# Altium footprint library Global Library.PcbLib: 82 footprints (part 6 of 6)
Each footprint in its own frame and in the unit in brackets; x right, y up, seen from the top. Pads: shape width x height; smd on the part's side, far side on the other; paste and mask are expansions set on the pad; w line width, h text height; cw(c..) or ccw(c..) is an arc to the next point about the centre after c.
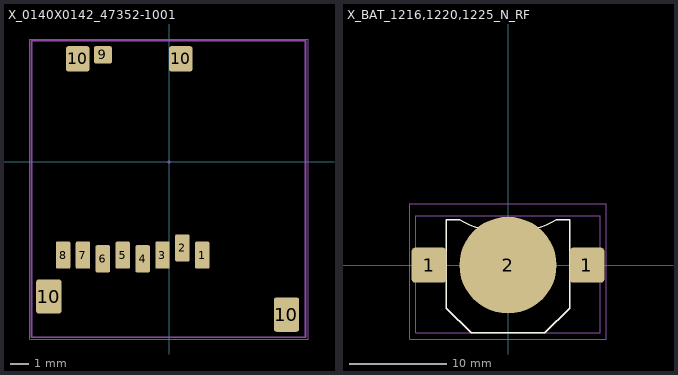
[diagram p5: the footprints below, top view; thin cyan lines are the x and y axes]

## X_0140X0142_47352-1001 [mm] "uSD Card Slot Molex"
height 1.88
pads (13):
  rrect20% 0.8x1.5 smd: 1(1.84,-5.16) 2(0.74,-4.76) 3(-0.36,-5.16) 4(-1.46,-5.36) 5(-2.56,-5.16) 6(-3.66,-5.36) 7(-4.76,-5.16) 8(-5.86,-5.16)
  rrect20% 1x0.95 smd: 9(-3.66,5.925)
  rrect20% 1.4x1.9 smd: 10(-6.65,-7.45) 10(6.5,-8.45)
  rrect20% 1.3x1.4 smd: 10(-5.05,5.7) 10(0.65,5.7)
Top Courtyard:
  lines w0.01: -0.1,0 0.1,0 0,0 0,0.1 0,-0.1 ; -7.7,-9.8 -7.7,6.8 7.7,6.8 7.7,-9.8 -7.7,-9.8
Top Assembly:
  lines w0.1: -7.6,-9.7 7.55,-9.7 7.55,6.7 -7.6,6.7 -7.6,-9.7
Top Assy SMT:
  lines w0.1: -7.6,-9.7 -7.6,6.7 7.55,6.7 7.55,-9.7 -7.6,-9.7
  text ".Designator" at 2.965,6.975 h1
3D body "473521001.stp": height 1.85, standoff -0.03, extent -7.122,-9.102 6.978,6.098
3D body "User Library-microsd card.step": height 1.9, standoff 0.9, extent -6.846,-11.767 4.166,3.233

## X_BAT_1216,1220,1225_N_RF [mm] "Battery Holder 1216, 1220, 1225"
height 2.2
pads (3):
  rrect20% 3.6x3.6 smd: 1(-8.15,0) 1(8.15,0)
  round 10 smd paste-10: 2(0,0)
Top Overlay:
  lines w0.15: -6.35,-4.445 -6.35,4.675 -5,4.675 ccw(c0,13.335) 5,4.675 6.35,4.675 6.35,-4.445 3.81,-6.985 -3.81,-6.985 -6.35,-4.445
Top Courtyard:
  lines w0.01: -10.16,-7.62 10.16,-7.62 10.16,6.35 -10.16,6.35 -10.16,-7.62
Top Assembly:
  lines w0.1: -9.525,-6.985 -9.525,5.08 9.525,5.08 9.525,-6.985 -9.525,-6.985
Top Assy SMT:
  lines w0.1: -9.525,-6.985 9.525,-6.985 9.525,5.08 -9.525,5.08 -9.525,-6.985
  text ".Designator" at -8.89,6.35 h1
3D body "User Library-CR1216.STEP": height 1.6, standoff 0, extent -6.2,-6.2 6.2,6.2
3D body "keystone-PN3000TR.STEP": height 3.15, standoff -0.02, extent -9.474,-6.921 9.474,5.143